# Altium footprint library PcbLib1.PcbLib: 150 footprints (part 3 of 10)
Each footprint in its own frame and in the unit in brackets; x right, y up, seen from the top. Pads: shape width x height; smd on the part's side, far side on the other; paste and mask are expansions set on the pad; w line width, h text height; cw(c..) or ccw(c..) is an arc to the next point about the centre after c.
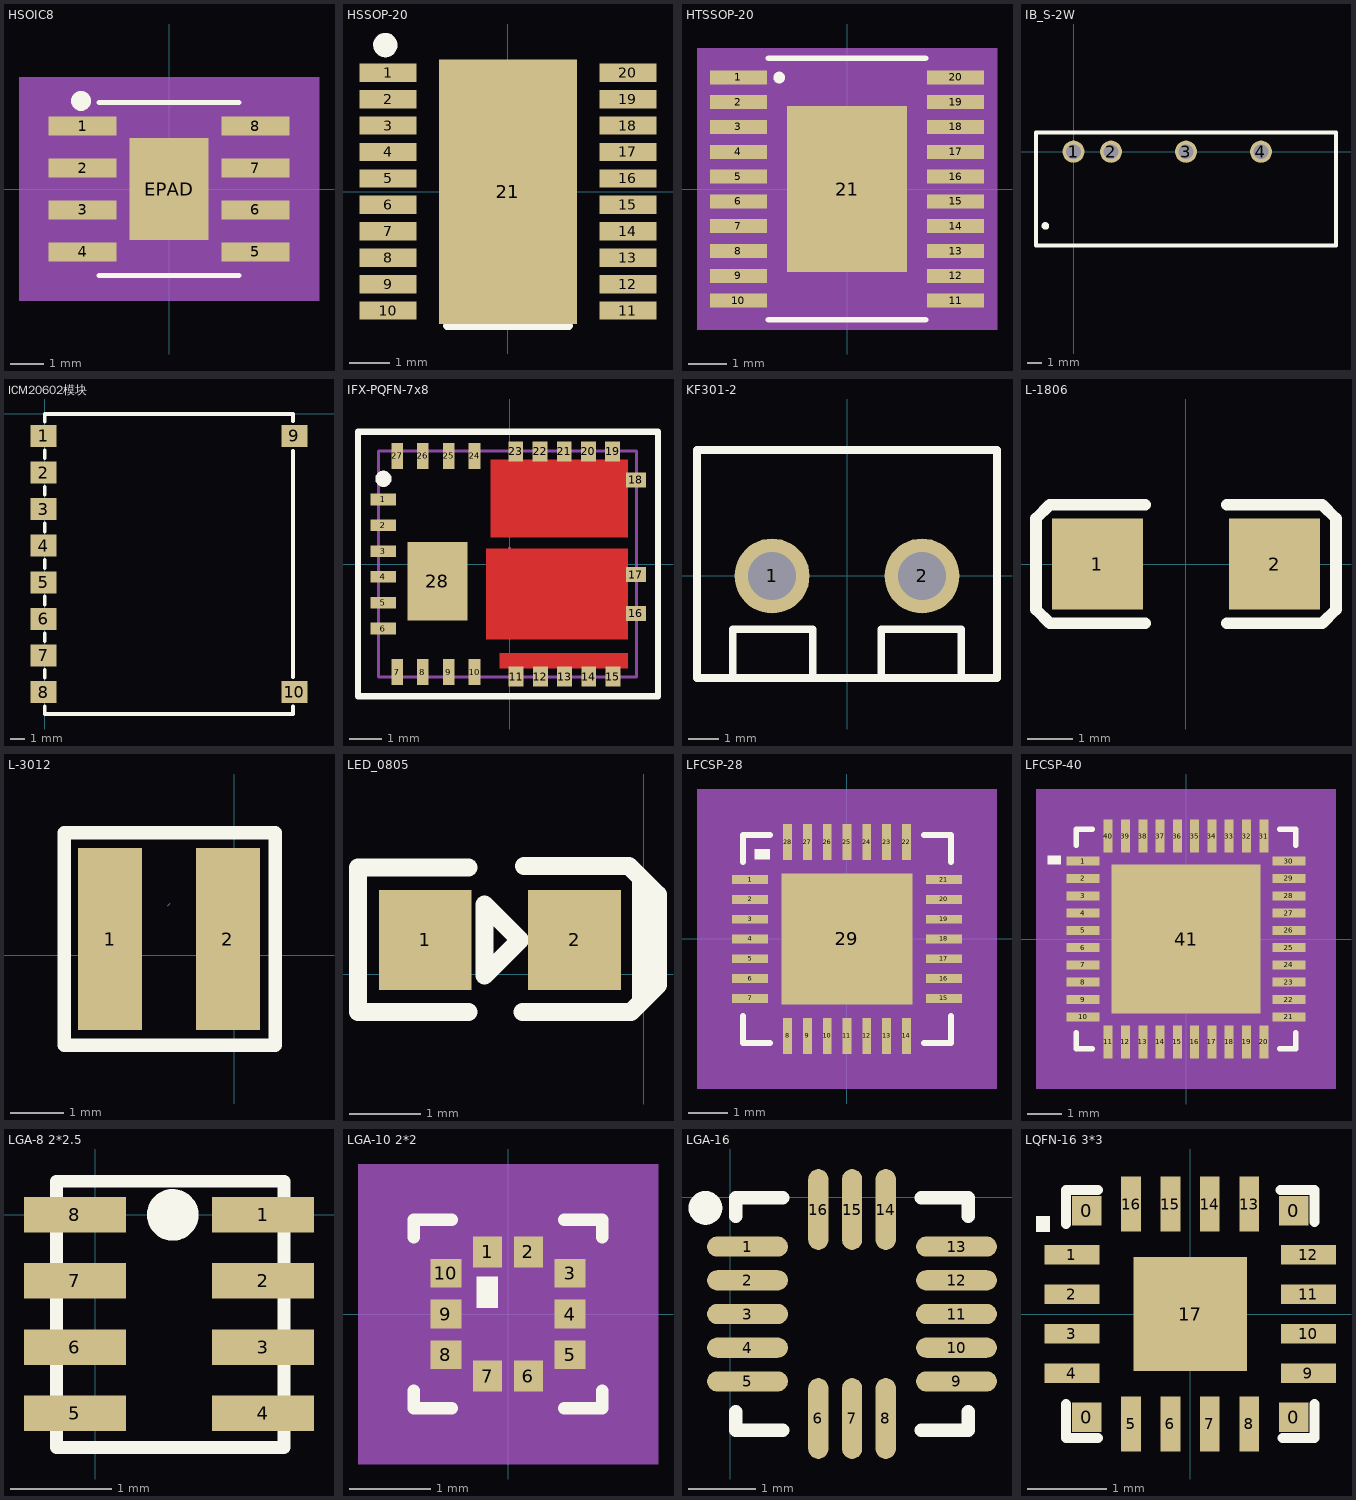
[diagram p2: the footprints below, top view; thin cyan lines are the x and y axes]

## HSOIC8 [mm]
pads (9):
  rect 2.067x0.583 smd paste+0 mask+0: 1(-2.615,1.905) 2(-2.615,0.635) 3(-2.615,-0.635) 4(-2.615,-1.905) 5(2.615,-1.905) 6(2.615,-0.635) 7(2.615,0.635) 8(2.615,1.905)
  rect 2.4x3.1 smd paste-1.537 mask+0: EPAD(0,0)
Top Overlay:
  lines w0.152: -2.121,-2.616 2.121,-2.616 ; -2.121,2.616 2.121,2.616
  lines w0.3: -2.663,2.815 ccw(c-2.661,2.665) -2.66,2.815
Top Paste:
  region: 1.1,1.45 -1.1,1.45 -1.1,0.1 1.1,0.1
  region: 1.1,-0.1 -1.1,-0.1 -1.1,-1.45 1.1,-1.45
Mechanical 5:
  region: 4.538,-3.378 -4.538,-3.378 -4.538,3.378 4.538,3.378
Mechanical 13:
  lines w0: -0.305,2.489 ccw(c0,2.489) 0.305,2.489
  lines w0.025: -3.099,-2.146 -3.099,-1.664 -1.994,-1.664 -1.994,-2.146 -3.099,-2.146 ; -3.099,-0.876 -3.099,-0.394 -1.994,-0.394 -1.994,-0.876 -3.099,-0.876 ; -3.099,0.394 -3.099,0.876 -1.994,0.876 -1.994,0.394 -3.099,0.394 ; -3.099,1.664 -3.099,2.146 -1.994,2.146 -1.994,1.664 -3.099,1.664 ; -1.994,-2.489 1.994,-2.489 1.994,2.489 -1.994,2.489 -1.994,-2.489 ; 1.994,-2.146 1.994,-1.664 3.099,-1.664 3.099,-2.146 1.994,-2.146 ; 1.994,-0.876 1.994,-0.394 3.099,-0.394 3.099,-0.876 1.994,-0.876 ; 1.994,0.394 1.994,0.876 3.099,0.876 3.099,0.394 1.994,0.394 ; 1.994,1.664 1.994,2.146 3.099,2.146 3.099,1.664 1.994,1.664
Mechanical 15:
  region: -2.502,-2.704 -4.157,-2.704 -4.157,2.704 -2.502,2.704 -2.502,2.997 2.502,2.997 2.502,2.704 4.157,2.704 4.157,-2.704 2.502,-2.704 2.502,-2.997 -2.502,-2.997
  lines w0.152: -4.157,-2.704 -4.157,2.704 -2.502,2.704 -2.502,2.997 2.502,2.997 2.502,2.704 4.157,2.704 4.157,-2.704 2.502,-2.704 2.502,-2.997 -2.502,-2.997 -2.502,-2.704 -4.157,-2.704
3D body "DDA8_3P1X2P4-L.step": height 1.68, standoff -0.05, extent -3.099,-2.489 3.099,2.489
3D body: height 0.25, standoff 0, extent 0,0 0.254,0.254

## HSSOP-20 [mm]
pads (21):
  rect 1.4x0.45 smd paste+0 mask+0.051: 1(-2.95,2.925) 2(-2.95,2.275) 3(-2.95,1.625) 4(-2.95,0.975) 5(-2.95,0.325) 6(-2.95,-0.325) 7(-2.95,-0.975) 8(-2.95,-1.625) 9(-2.95,-2.275) 10(-2.95,-2.925) 11(2.95,-2.925) 12(2.95,-2.275) 13(2.95,-1.625) 14(2.95,-0.975) 15(2.95,-0.325) 16(2.95,0.325) 17(2.95,0.975) 18(2.95,1.625) 19(2.95,2.275) 20(2.95,2.925)
  rect 3.4x6.5 smd paste-3.237 mask-3.238: 21(0,0)
Top Overlay:
  lines w0.2: -1.5,-3.3 1.5,-3.3
  lines w0.3: -3.018,3.754 ccw(c-3.017,3.604) -3.016,3.754
Top Paste:
  region: -1.574,-2.137 -1.575,-2.128 -1.575,2.128 -1.574,2.137 -1.571,2.146 -1.567,2.154 -1.561,2.161 -1.554,2.167 -1.546,2.171 -1.537,2.174 -1.528,2.175 1.528,2.175 1.537,2.174 1.546,2.171 1.554,2.167 1.561,2.161 1.567,2.154 1.571,2.146 1.574,2.137 1.575,2.128 1.575,-2.128 1.574,-2.137 1.571,-2.146 1.567,-2.154 1.561,-2.161 1.554,-2.167 1.546,-2.171 1.537,-2.174 1.528,-2.175 -1.528,-2.175 -1.537,-2.174 -1.546,-2.171 -1.554,-2.167 -1.561,-2.161 -1.567,-2.154 -1.571,-2.146
Top Solder:
  region: -1.574,-2.137 -1.575,-2.128 -1.575,2.128 -1.574,2.137 -1.571,2.146 -1.567,2.154 -1.561,2.161 -1.554,2.167 -1.546,2.171 -1.537,2.174 -1.528,2.175 1.528,2.175 1.537,2.174 1.546,2.171 1.554,2.167 1.561,2.161 1.567,2.154 1.571,2.146 1.574,2.137 1.575,2.128 1.575,-2.128 1.574,-2.137 1.571,-2.146 1.567,-2.154 1.561,-2.161 1.554,-2.167 1.546,-2.171 1.537,-2.174 1.528,-2.175 -1.528,-2.175 -1.537,-2.174 -1.546,-2.171 -1.554,-2.167 -1.561,-2.161 -1.567,-2.154 -1.571,-2.146
3D body "PWP0020A.stp": height 1, standoff 0, extent -3.21,-3.25 3.211,3.25
3D body: height 0.25, standoff 0, extent 0,0 0.254,0.254

## HTSSOP-20 [mm]
pads (21):
  rect 1.5x0.365 smd: 1(-2.845,2.925) 2(-2.845,2.275) 3(-2.845,1.625) 4(-2.845,0.975) 5(-2.845,0.325) 6(-2.845,-0.325) 7(-2.845,-0.975) 8(-2.845,-1.625) 9(-2.845,-2.275) 10(-2.845,-2.925) 11(2.845,-2.925) 12(2.845,-2.275) 13(2.845,-1.625) 14(2.845,-0.975) 15(2.845,-0.325) 16(2.845,0.325) 17(2.845,0.975) 18(2.845,1.625) 19(2.845,2.275) 20(2.845,2.925)
  rect 3.15x4.343 smd: 21(0,0)
Top Overlay:
  circle w0.152: c-1.778,2.921 r0.076
  lines w0.152: -2.054,-3.429 2.054,-3.429 ; -2.054,3.429 2.054,3.429
Mechanical 5:
  region: 3.931,-3.683 -3.931,-3.683 -3.931,3.683 3.931,3.683
Mechanical 13:
  circle w0: c-2.139,2.925 r0.076
  lines w0: -0.305,3.302 ccw(c0,3.302) 0.305,3.302
  lines w0.025: -3.2,-3.077 -2.248,-3.077 -2.248,-2.773 -3.2,-2.773 -3.2,-3.077 ; -3.2,-2.427 -2.248,-2.427 -2.248,-2.123 -3.2,-2.123 -3.2,-2.427 ; -3.2,-1.777 -2.248,-1.777 -2.248,-1.473 -3.2,-1.473 -3.2,-1.777 ; -3.2,-1.127 -2.248,-1.127 -2.248,-0.823 -3.2,-0.823 -3.2,-1.127 ; -3.2,-0.477 -2.248,-0.477 -2.248,-0.173 -3.2,-0.173 -3.2,-0.477 ; -3.2,0.173 -2.248,0.173 -2.248,0.477 -3.2,0.477 -3.2,0.173 ; -3.2,0.823 -2.248,0.823 -2.248,1.127 -3.2,1.127 -3.2,0.823 ; -3.2,1.473 -2.248,1.473 -2.248,1.777 -3.2,1.777 -3.2,1.473 ; -3.2,2.123 -2.248,2.123 -2.248,2.427 -3.2,2.427 -3.2,2.123 ; -3.2,2.773 -2.248,2.773 -2.248,3.077 -3.2,3.077 -3.2,2.773 ; -2.248,-3.302 -2.248,3.302 2.248,3.302 2.248,-3.302 -2.248,-3.302 ; 2.248,-3.077 3.2,-3.077 3.2,-2.773 2.248,-2.773 2.248,-3.077 ; 2.248,-2.427 3.2,-2.427 3.2,-2.123 2.248,-2.123 2.248,-2.427 ; 2.248,-1.777 3.2,-1.777 3.2,-1.473 2.248,-1.473 2.248,-1.777 ; 2.248,-1.127 3.2,-1.127 3.2,-0.823 2.248,-0.823 2.248,-1.127 ; 2.248,-0.477 3.2,-0.477 3.2,-0.173 2.248,-0.173 2.248,-0.477 ; 2.248,0.173 3.2,0.173 3.2,0.477 2.248,0.477 2.248,0.173 ; 2.248,0.823 3.2,0.823 3.2,1.127 2.248,1.127 2.248,0.823 ; 2.248,1.473 3.2,1.473 3.2,1.777 2.248,1.777 2.248,1.473 ; 2.248,2.123 3.2,2.123 3.2,2.427 2.248,2.427 2.248,2.123 ; 2.248,2.773 3.2,2.773 3.2,3.077 2.248,3.077 2.248,2.773
Mechanical 15:
  region: -2.502,-3.301 -3.804,-3.301 -3.804,3.301 -2.502,3.301 -2.502,3.556 2.502,3.556 2.502,3.301 3.804,3.301 3.804,-3.301 2.502,-3.301 2.502,-3.556 -2.502,-3.556
  lines w0.152: -3.804,-3.301 -2.502,-3.301 -2.502,-3.556 2.502,-3.556 2.502,-3.301 3.804,-3.301 3.804,3.301 2.502,3.301 2.502,3.556 -2.502,3.556 -2.502,3.301 -3.804,3.301 -3.804,-3.301
3D body "MXA20A.step": height 1.09, standoff 0, extent -3.2,-3.302 3.2,3.302
3D body: height 0.25, standoff 0, extent 0,0 0.254,0.254

## IB_S-2W [mm]
pads (4):
  round 1.5 hole 1: 1(0,0) 2(2.54,0) 3(7.62,0) 4(12.7,0)
Top Overlay:
  circle w0.254: c-1.905,-5.029 r0.13
  lines w0.254: -2.54,-6.35 17.78,-6.35 17.78,1.295 -2.54,1.295 -2.54,-6.35

## ICM20602模块 [mil]
pads (10):
  rect 70x60 smd: 1(-3,-60) 2(-3,-160) 3(-3,-260) 4(-3,-360) 5(-3,-460) 6(-3,-560) 7(-3,-660) 8(-3,-760) 9(683,-60) 10(683,-760)
Top Overlay:
  lines w10: 0,-820 679,-820 ; 0,-818 0,-799 ; 0,-721 0,-699 ; 0,-621 0,-599 ; 0,-521 0,-499 ; 0,-421 0,-399 ; 0,-321 0,-299 ; 0,-221 0,-199 ; 0,-121 0,-99 ; 0,-21 0,0 679,0 679,-20 ; 679,-799 679,-820 ; 679,-720 679,-100 ; 679,-820 679,-820

## IFX-PQFN-7x8 [mm] "PQFN, 28 Pins, 7mm L X 8mm W X 1mm H body"
height 1
pads (28):
  rect 0.8x0.36 smd paste-0.8 mask+0: 1(-3.917,2) 2(-3.917,1.2) 3(-3.917,0.4) 4(-3.917,-0.4) 5(-3.917,-1.2) 6(-3.917,-2)
  rect 0.36x0.8 smd paste-0.8 mask+0: 7(-3.487,-3.35) 8(-2.687,-3.35) 9(-1.887,-3.35) 10(-1.087,-3.35) 24(-1.087,3.35) 25(-1.887,3.35) 26(-2.687,3.35) 27(-3.487,3.35)
  rect 0.46x0.62 smd paste-0.62 mask+0: 11(0.203,-3.49) 12(0.953,-3.49) 13(1.703,-3.49) 14(2.453,-3.49) 15(3.203,-3.49) 19(3.192,3.49) 20(2.442,3.49) 21(1.692,3.49) 22(0.943,3.49) 23(0.192,3.49)
  rect 0.62x0.46 smd paste-0.62 mask+0: 16(3.917,-1.53) 17(3.918,-0.33) 18(3.918,2.607)
  rect 1.86x2.43 smd paste-2.43 mask+0: 28(-2.238,-0.53)
Top Layer:
  region: -0.592,0.83 -0.592,3.23 3.658,3.23 3.658,0.83
  region: 3.658,0.475 3.658,-2.335 -0.722,-2.335 -0.722,0.475
  region: 3.658,-2.77 -0.312,-2.77 -0.312,-3.23 3.658,-3.23
Top Overlay:
  circle w0.25: c-3.912,2.642 r0.125
  lines w0.2: -4.7,-4.1 -4.7,4.1 4.6,4.1 4.6,-4.1 -4.7,-4.1
Top Paste:
  drawing of 43 lines, arcs and shapes, not listed
Mechanical 13:
  lines w0.1: -4.067,3.5 3.933,3.5 3.933,-3.5 -4.067,-3.5 -4.067,3.5
Mechanical 15:
  lines w0.1: -0.5,0 0.5,0 ; 0,-0.5 0,0.5
3D body "PQFN-27-X1.stp": height 1.01, standoff 0, extent -4.067,-3.5 3.933,3.5

## KF301-2 [mm]
pads (2):
  round 2.5 hole 1.6: 1(-2.499,0) 2(2.499,0)
Top Overlay:
  lines w0.254: -3.81,-3.302 -3.81,-1.778 -1.143,-1.778 -1.143,-3.302 ; 1.143,-3.302 1.143,-1.778 3.81,-1.778 3.81,-3.302 ; -5.001,-3.401 4.999,-3.401 4.999,4.199 -5.001,4.199 -5.001,-3.401
3D body "User Library-Terminal-Screw-3A-2way.STEP": height 10, standoff -3, extent -5.6,-3.394 5,4.206

## L-1806 [mm]
pads (2):
  rect 1.999x2.002 smd: 1(-1.949,0)
  rect 2.002x2.002 smd: 2(1.95,0)
Top Overlay:
  lines w0.254: -0.9,-1.3 -3.001,-1.3 -3.3,-1.001 -3.3,1.001 -3.001,1.3 -0.9,1.3 ; 0.901,-1.3 2.999,-1.3 3.301,-1.001 3.301,1.001 2.999,1.3 0.901,1.3
3D body "User Library-1806.STEP": height 1.6, standoff 0, extent -2.25,-0.8 2.25,0.8

## L-3012 [mm]
pads (2):
  rect 1.2x3.4 smd: 1(-2.321,0.303) 2(-0.121,0.303)
Top Overlay:
  lines w0.254: -3.175,-1.676 0.762,-1.676 0.762,2.286 -3.175,2.286 -3.175,-1.676
Mechanical 15:
  lines w0.003: -1.246,0.924 -1.196,0.975

## LED_0805 [mm]
pads (2):
  rect 1.3x1.4 smd: 1(-3.071,0.481) 2(-0.97,0.481)
Top Overlay:
  lines w0.254: -2.464,-0.533 -4.013,-0.533 -4.013,1.499 -2.464,1.499 ; -1.702,-0.533 -0.178,-0.533 0.203,-0.152 0.203,1.118 -0.203,1.524 -1.676,1.524 ; -0.038,-0.318 -0.038,1.283 ; -2.238,-0.018 -2.238,0.983 -1.737,0.483 ; -2.238,-0.018 -2.238,-0.018 ; -2.238,-0.018 -1.737,0.483 ; -1.737,0.483 -1.737,0.483
Mechanical 15:
  lines w0.003: -1.93,0.357 -1.88,0.408
3D body "everlight-17-21-0805LED-YELLOW.STEP": height 0.8, standoff -0.31, extent -3.032,-0.142 -1.032,1.108

## LFCSP-28 [mm]
pads (29):
  rect 0.908x0.225 smd paste+0 mask+0: 1(-2.448,1.5) 2(-2.448,1) 3(-2.448,0.5) 4(-2.448,0) 5(-2.448,-0.5) 6(-2.448,-1) 7(-2.448,-1.5) 15(2.448,-1.5) 16(2.448,-1) 17(2.448,-0.5) 18(2.448,0) 19(2.448,0.5) 20(2.448,1) 21(2.448,1.5)
  rect 0.225x0.908 smd paste+0 mask+0: 8(-1.5,-2.448) 9(-1,-2.448) 10(-0.5,-2.448) 11(0,-2.448) 12(0.5,-2.448) 13(1,-2.448) 14(1.5,-2.448) 22(1.5,2.448) 23(1,2.448) 24(0.5,2.448) 25(0,2.448) 26(-0.5,2.448) 27(-1,2.448) 28(-1.5,2.448)
  rect 3.3x3.3 smd paste-1.637 mask+0: 29(0,0)
Top Overlay:
  region: -2.334,2.013 -2.334,2.267 -1.953,2.267 -1.953,2.013
  lines w0.152: -2.629,-1.945 -2.629,-2.629 -1.945,-2.629 ; -2.629,1.945 -2.629,2.629 -1.945,2.629 ; 1.945,-2.629 2.629,-2.629 2.629,-1.945 ; 1.945,2.629 2.629,2.629 2.629,1.945
Top Paste:
  region: -0.1,1.55 -1.55,1.55 -1.55,0.1 -0.1,0.1
  region: -0.1,-0.1 -1.55,-0.1 -1.55,-1.55 -0.1,-1.55
  region: 1.55,1.55 0.1,1.55 0.1,0.1 1.55,0.1
  region: 1.55,-0.1 0.1,-0.1 0.1,-1.55 1.55,-1.55
Mechanical 5:
  region: 3.791,-3.791 -3.791,-3.791 -3.791,3.791 3.791,3.791
Mechanical 13:
  lines w0.025: -2.502,1.232 -1.232,2.502 ; -2.502,-2.502 2.502,-2.502 2.502,2.502 -2.502,2.502 -2.502,-2.502 ; -2.502,-1.652 -2.502,-1.348 -2.502,-1.652 ; -2.502,-1.152 -2.502,-0.848 -2.502,-1.152 ; -2.502,-0.652 -2.502,-0.348 -2.502,-0.652 ; -2.502,-0.152 -2.502,0.152 -2.502,-0.152 ; -2.502,0.348 -2.502,0.652 -2.502,0.348 ; -2.502,0.848 -2.502,1.152 -2.502,0.848 ; -2.502,1.348 -2.502,1.652 -2.502,1.348 ; -1.652,-2.502 -1.348,-2.502 -1.652,-2.502 ; -1.652,2.502 -1.348,2.502 -1.652,2.502 ; -1.152,-2.502 -0.848,-2.502 -1.152,-2.502 ; -1.152,2.502 -0.848,2.502 -1.152,2.502 ; -0.652,-2.502 -0.348,-2.502 -0.652,-2.502 ; -0.652,2.502 -0.348,2.502 -0.652,2.502 ; -0.152,-2.502 0.152,-2.502 -0.152,-2.502 ; -0.152,2.502 0.152,2.502 -0.152,2.502 ; 0.348,-2.502 0.652,-2.502 0.348,-2.502 ; 0.348,2.502 0.652,2.502 0.348,2.502 ; 0.848,-2.502 1.152,-2.502 0.848,-2.502 ; 0.848,2.502 1.152,2.502 0.848,2.502 ; 1.348,-2.502 1.652,-2.502 1.348,-2.502 ; 1.348,2.502 1.652,2.502 1.348,2.502 ; 2.502,-1.652 2.502,-1.348 2.502,-1.652 ; 2.502,-1.152 2.502,-0.848 2.502,-1.152 ; 2.502,-0.652 2.502,-0.348 2.502,-0.652 ; 2.502,-0.152 2.502,0.152 2.502,-0.152 ; 2.502,0.348 2.502,0.652 2.502,0.348 ; 2.502,0.848 2.502,1.152 2.502,0.848 ; 2.502,1.348 2.502,1.652 2.502,1.348
  text "*" at -2.311,1.115 h1.27
Mechanical 15:
  region: -2.12,-3.01 -3.01,-3.01 -3.01,-2.12 -3.41,-2.12 -3.41,2.12 -3.01,2.12 -3.01,3.01 -2.12,3.01 -2.12,3.41 2.12,3.41 2.12,3.01 3.01,3.01 3.01,2.12 3.41,2.12 3.41,-2.12 3.01,-2.12 3.01,-3.01 2.12,-3.01 2.12,-3.41 -2.12,-3.41
  lines w0.152: -3.41,-2.12 -3.01,-2.12 -3.01,-3.01 -2.12,-3.01 -2.12,-3.41 2.12,-3.41 2.12,-3.01 3.01,-3.01 3.01,-2.12 3.41,-2.12 3.41,2.12 3.01,2.12 3.01,3.01 2.12,3.01 2.12,3.41 -2.12,3.41 -2.12,3.01 -3.01,3.01 -3.01,2.12 -3.41,2.12 -3.41,-2.12
3D body "CP_28_6-M.step": height 0.97, standoff 0, extent -2.502,-2.502 2.502,2.502
3D body: height 0.25, standoff 0, extent 0,0 0.254,0.254

## LFCSP-40 [mm]
pads (41):
  rect 0.948x0.26 smd paste+0 mask+0: 1(-2.974,2.25) 2(-2.974,1.75) 3(-2.974,1.25) 4(-2.974,0.75) 5(-2.974,0.25) 6(-2.974,-0.25) 7(-2.974,-0.75) 8(-2.974,-1.25) 9(-2.974,-1.75) 10(-2.974,-2.25) 21(2.974,-2.25) 22(2.974,-1.75) 23(2.974,-1.25) 24(2.974,-0.75) 25(2.974,-0.25) 26(2.974,0.25) 27(2.974,0.75) 28(2.974,1.25) 29(2.974,1.75) 30(2.974,2.25)
  rect 0.26x0.948 smd paste+0 mask+0: 11(-2.25,-2.974) 12(-1.75,-2.974) 13(-1.25,-2.974) 14(-0.75,-2.974) 15(-0.25,-2.974) 16(0.25,-2.974) 17(0.75,-2.974) 18(1.25,-2.974) 19(1.75,-2.974) 20(2.25,-2.974) 31(2.25,2.974) 32(1.75,2.974) 33(1.25,2.974) 34(0.75,2.974) 35(0.25,2.974) 36(-0.25,2.974) 37(-0.75,2.974) 38(-1.25,2.974) 39(-1.75,2.974) 40(-2.25,2.974)
  rect 4.3x4.3 smd paste-2.137 mask+0: 41(0,0)
Top Overlay:
  region: -3.619,2.159 -4,2.159 -4,2.413 -3.619,2.413
  lines w0.152: -3.175,-2.713 -3.175,-3.175 -2.713,-3.175 ; -3.175,2.713 -3.175,3.175 -2.713,3.175 ; 2.713,-3.175 3.175,-3.175 3.175,-2.713 ; 2.713,3.175 3.175,3.175 3.175,2.713
Top Paste:
  region: 2.05,-0.817 0.817,-0.817 0.817,-2.05 2.05,-2.05
  region: 2.05,0.617 0.817,0.617 0.817,-0.617 2.05,-0.617
  region: 2.05,2.05 0.817,2.05 0.817,0.817 2.05,0.817
  region: 0.617,-0.817 -0.617,-0.817 -0.617,-2.05 0.617,-2.05
  region: 0.617,0.617 -0.617,0.617 -0.617,-0.617 0.617,-0.617
  region: 0.617,2.05 -0.617,2.05 -0.617,0.817 0.617,0.817
  region: -0.817,-0.817 -2.05,-0.817 -2.05,-2.05 -0.817,-2.05
  region: -0.817,0.617 -2.05,0.617 -2.05,-0.617 -0.817,-0.617
  region: -0.817,2.05 -2.05,2.05 -2.05,0.817 -0.817,0.817
Mechanical 5:
  region: 4.337,-4.337 -4.337,-4.337 -4.337,4.337 4.337,4.337
Mechanical 13:
  lines w0.025: -3.048,1.778 -1.778,3.048 ; -3.048,-3.048 -3.048,3.048 3.048,3.048 3.048,-3.048 -3.048,-3.048 ; -3.048,-2.4 -3.048,-2.1 -3.048,-2.4 ; -3.048,-1.9 -3.048,-1.6 -3.048,-1.9 ; -3.048,-1.4 -3.048,-1.1 -3.048,-1.4 ; -3.048,-0.9 -3.048,-0.6 -3.048,-0.9 ; -3.048,-0.4 -3.048,-0.1 -3.048,-0.4 ; -3.048,0.1 -3.048,0.4 -3.048,0.1 ; -3.048,0.6 -3.048,0.9 -3.048,0.6 ; -3.048,1.1 -3.048,1.4 -3.048,1.1 ; -3.048,1.6 -3.048,1.9 -3.048,1.6 ; -3.048,2.1 -3.048,2.4 -3.048,2.1 ; -2.4,-3.048 -2.1,-3.048 -2.4,-3.048 ; -2.4,3.048 -2.1,3.048 -2.4,3.048 ; -1.9,-3.048 -1.6,-3.048 -1.9,-3.048 ; -1.9,3.048 -1.6,3.048 -1.9,3.048 ; -1.4,-3.048 -1.1,-3.048 -1.4,-3.048 ; -1.4,3.048 -1.1,3.048 -1.4,3.048 ; -0.9,-3.048 -0.6,-3.048 -0.9,-3.048 ; -0.9,3.048 -0.6,3.048 -0.9,3.048 ; -0.4,-3.048 -0.1,-3.048 -0.4,-3.048 ; -0.4,3.048 -0.1,3.048 -0.4,3.048 ; 0.1,-3.048 0.4,-3.048 0.1,-3.048 ; 0.1,3.048 0.4,3.048 0.1,3.048 ; 0.6,-3.048 0.9,-3.048 0.6,-3.048 ; 0.6,3.048 0.9,3.048 0.6,3.048 ; 1.1,-3.048 1.4,-3.048 1.1,-3.048 ; 1.1,3.048 1.4,3.048 1.1,3.048 ; 1.6,-3.048 1.9,-3.048 1.6,-3.048 ; 1.6,3.048 1.9,3.048 1.6,3.048 ; 2.1,-3.048 2.4,-3.048 2.1,-3.048 ; 2.1,3.048 2.4,3.048 2.1,3.048 ; 3.048,-2.4 3.048,-2.1 3.048,-2.4 ; 3.048,-1.9 3.048,-1.6 3.048,-1.9 ; 3.048,-1.4 3.048,-1.1 3.048,-1.4 ; 3.048,-0.9 3.048,-0.6 3.048,-0.9 ; 3.048,-0.4 3.048,-0.1 3.048,-0.4 ; 3.048,0.1 3.048,0.4 3.048,0.1 ; 3.048,0.6 3.048,0.9 3.048,0.6 ; 3.048,1.1 3.048,1.4 3.048,1.1 ; 3.048,1.6 3.048,1.9 3.048,1.6 ; 3.048,2.1 3.048,2.4 3.048,2.1
  text "*" at -2.818,1.865 h1.27
Mechanical 15:
  region: -2.888,-3.556 -3.556,-3.556 -3.556,-2.888 -3.956,-2.888 -3.956,2.888 -3.556,2.888 -3.556,3.556 -2.888,3.556 -2.888,3.956 2.888,3.956 2.888,3.556 3.556,3.556 3.556,2.888 3.956,2.888 3.956,-2.888 3.556,-2.888 3.556,-3.556 2.888,-3.556 2.888,-3.956 -2.888,-3.956
  lines w0.152: -3.956,-2.888 -3.956,2.888 -3.556,2.888 -3.556,3.556 -2.888,3.556 -2.888,3.956 2.888,3.956 2.888,3.556 3.556,3.556 3.556,2.888 3.956,2.888 3.956,-2.888 3.556,-2.888 3.556,-3.556 2.888,-3.556 2.888,-3.956 -2.888,-3.956 -2.888,-3.556 -3.556,-3.556 -3.556,-2.888 -3.956,-2.888
3D body "CP_40_10.step": height 0.75, standoff 0, extent -3.048,-3.048 3.048,3.048
3D body: height 0.25, standoff 0, extent 0,0 0.254,0.254

## LGA-8 2*2.5 [mm]
pads (8):
  rect 1x0.35 smd: 1(1.65,0) 2(1.65,-0.65) 3(1.65,-1.3) 4(1.65,-1.95) 5(-0.2,-1.95) 6(-0.2,-1.3) 7(-0.2,-0.65) 8(-0.2,0)
Top Overlay:
  circle w0.254: c0.762,0 r0.127
  lines w0.127: -0.381,-2.286 1.854,-2.286 1.854,0.33 -0.381,0.33 -0.381,-2.286

## LGA-10 2*2 [mil]
pads (10):
  rect 13.94x14.94 smd paste+0 mask+0: 1(-9.84,30) 2(9.84,30) 6(9.84,-30) 7(-9.84,-30)
  rect 14.94x13.94 smd paste+0 mask+0: 3(30,19.68) 4(30,0) 5(30,-19.68) 8(-30,-19.68) 9(-30,0) 10(-30,19.68)
Top Overlay:
  region: -5,18 -5,3 -15,3 -15,18
  lines w6: -45.5,-37 -45.5,-45.5 -27.16,-45.5 ; -45.5,37 -45.5,45.5 -27.16,45.5 ; 27.16,-45.5 45.5,-45.5 45.5,-37 ; 27.16,45.5 45.5,45.5 45.5,37
Mechanical 5:
  region: 72.47,-72.47 -72.47,-72.47 -72.47,72.47 72.47,72.47
Mechanical 13:
  lines w1: -40.5,-9.5 9.5,40.5 ; -40.5,-40.5 -40.5,40.5 40.5,40.5 40.5,-40.5 -40.5,-40.5 ; -40.5,-24.68 -35.5,-24.68 -35.5,-14.69 -40.5,-14.69 -40.5,-24.68 ; -40.5,-5 -35.5,-5 -35.5,5 -40.5,5 -40.5,-5 ; -40.5,14.69 -35.5,14.69 -35.5,24.68 -40.5,24.68 -40.5,14.69 ; -14.84,-40.5 -14.84,-35.5 -4.84,-35.5 -4.84,-40.5 -14.84,-40.5 ; -14.84,35.5 -14.84,40.5 -4.84,40.5 -4.84,35.5 -14.84,35.5 ; 4.84,-40.5 4.84,-35.5 14.84,-35.5 14.84,-40.5 4.84,-40.5 ; 4.84,35.5 4.84,40.5 14.84,40.5 14.84,35.5 4.84,35.5 ; 35.5,-24.68 35.5,-14.69 40.5,-14.69 40.5,-24.68 35.5,-24.68 ; 35.5,-5 35.5,5 40.5,5 40.5,-5 35.5,-5 ; 35.5,14.69 35.5,24.68 40.5,24.68 40.5,14.69 35.5,14.69
  text "*" at -35.03,4.53 h50
Mechanical 15:
  region: -36.81,-60.5 -60.5,-60.5 -60.5,-46.65 -60.5,46.65 -60.5,60.5 -36.81,60.5 36.81,60.5 60.5,60.5 60.5,46.65 60.5,-46.65 60.5,-60.5 36.81,-60.5
  lines w6: -60.5,-60.5 -36.81,-60.5 36.81,-60.5 60.5,-60.5 60.5,-46.65 60.5,46.65 60.5,60.5 36.81,60.5 -36.81,60.5 -60.5,60.5 -60.5,46.65 -60.5,-46.65 -60.5,-60.5
3D body: height 10, standoff 0, extent 0,0 10,10
3D body "QFN_BMP388.step": height 32.09, standoff 0, extent -40.51,-40.51 40.52,40.52

## LGA-16 [mm]
height 1.75
pads (16):
  oval 1.2x0.3 smd: 1(0.253,-0.733) 2(0.253,-1.233) 3(0.253,-1.733) 4(0.253,-2.233) 5(0.253,-2.733) 9(3.353,-2.733) 10(3.353,-2.233) 11(3.353,-1.733) 12(3.353,-1.233) 13(3.353,-0.733)
  oval 0.3x1.2 smd: 6(1.304,-3.283) 7(1.803,-3.283) 8(2.304,-3.283) 14(2.304,-0.183) 15(1.803,-0.183) 16(1.304,-0.183)
Top Overlay:
  lines w0.2: 0.078,-3.183 0.078,-3.458 0.778,-3.458 ; 0.078,-0.283 0.078,-0.008 0.778,-0.008 ; 2.828,-3.458 3.528,-3.458 3.528,-3.183 ; 2.828,-0.008 3.528,-0.008 3.528,-0.283
  lines w0.25: -0.246,-0.161 cw(c-0.371,-0.16) -0.246,-0.158
3D body "User Library-LIS331AL.STEP": height 1, standoff -0.01, extent 0.304,-3.233 3.304,-0.233

## LQFN-16 3*3 [mm]
pads (21):
  rect 0.375x0.375 smd: 0(-1.312,-1.312) 0(-1.312,1.312) 0(1.312,-1.312) 0(1.312,1.312)
  rect 0.7x0.25 smd: 1(-1.5,0.75) 2(-1.5,0.25) 3(-1.5,-0.25) 4(-1.5,-0.75) 9(1.5,-0.75) 10(1.5,-0.25) 11(1.5,0.25) 12(1.5,0.75)
  rect 0.25x0.7 smd: 5(-0.75,-1.395) 6(-0.25,-1.395) 7(0.25,-1.395) 8(0.75,-1.395) 13(0.75,1.395) 14(0.25,1.395) 15(-0.25,1.395) 16(-0.75,1.395)
  rect 1.44x1.44 smd: 17(0,0)
Top Overlay:
  rectangle: -1.956,1.041 -1.778,1.245
  lines w0.127: -1.575,-1.143 -1.575,-1.575 -1.168,-1.575 ; -1.575,1.143 -1.575,1.575 -1.168,1.575 ; 1.143,1.575 1.575,1.575 1.575,1.168 ; 1.168,-1.575 1.575,-1.575 1.575,-1.143